# Altium footprint library Horizont_11_12_2017.PcbLib: 257 footprints (part 15 of 17)
Each footprint in its own frame and in the unit in brackets; x right, y up, seen from the top. Pads: shape width x height; smd on the part's side, far side on the other; paste and mask are expansions set on the pad; w line width, h text height; cw(c..) or ccw(c..) is an arc to the next point about the centre after c.
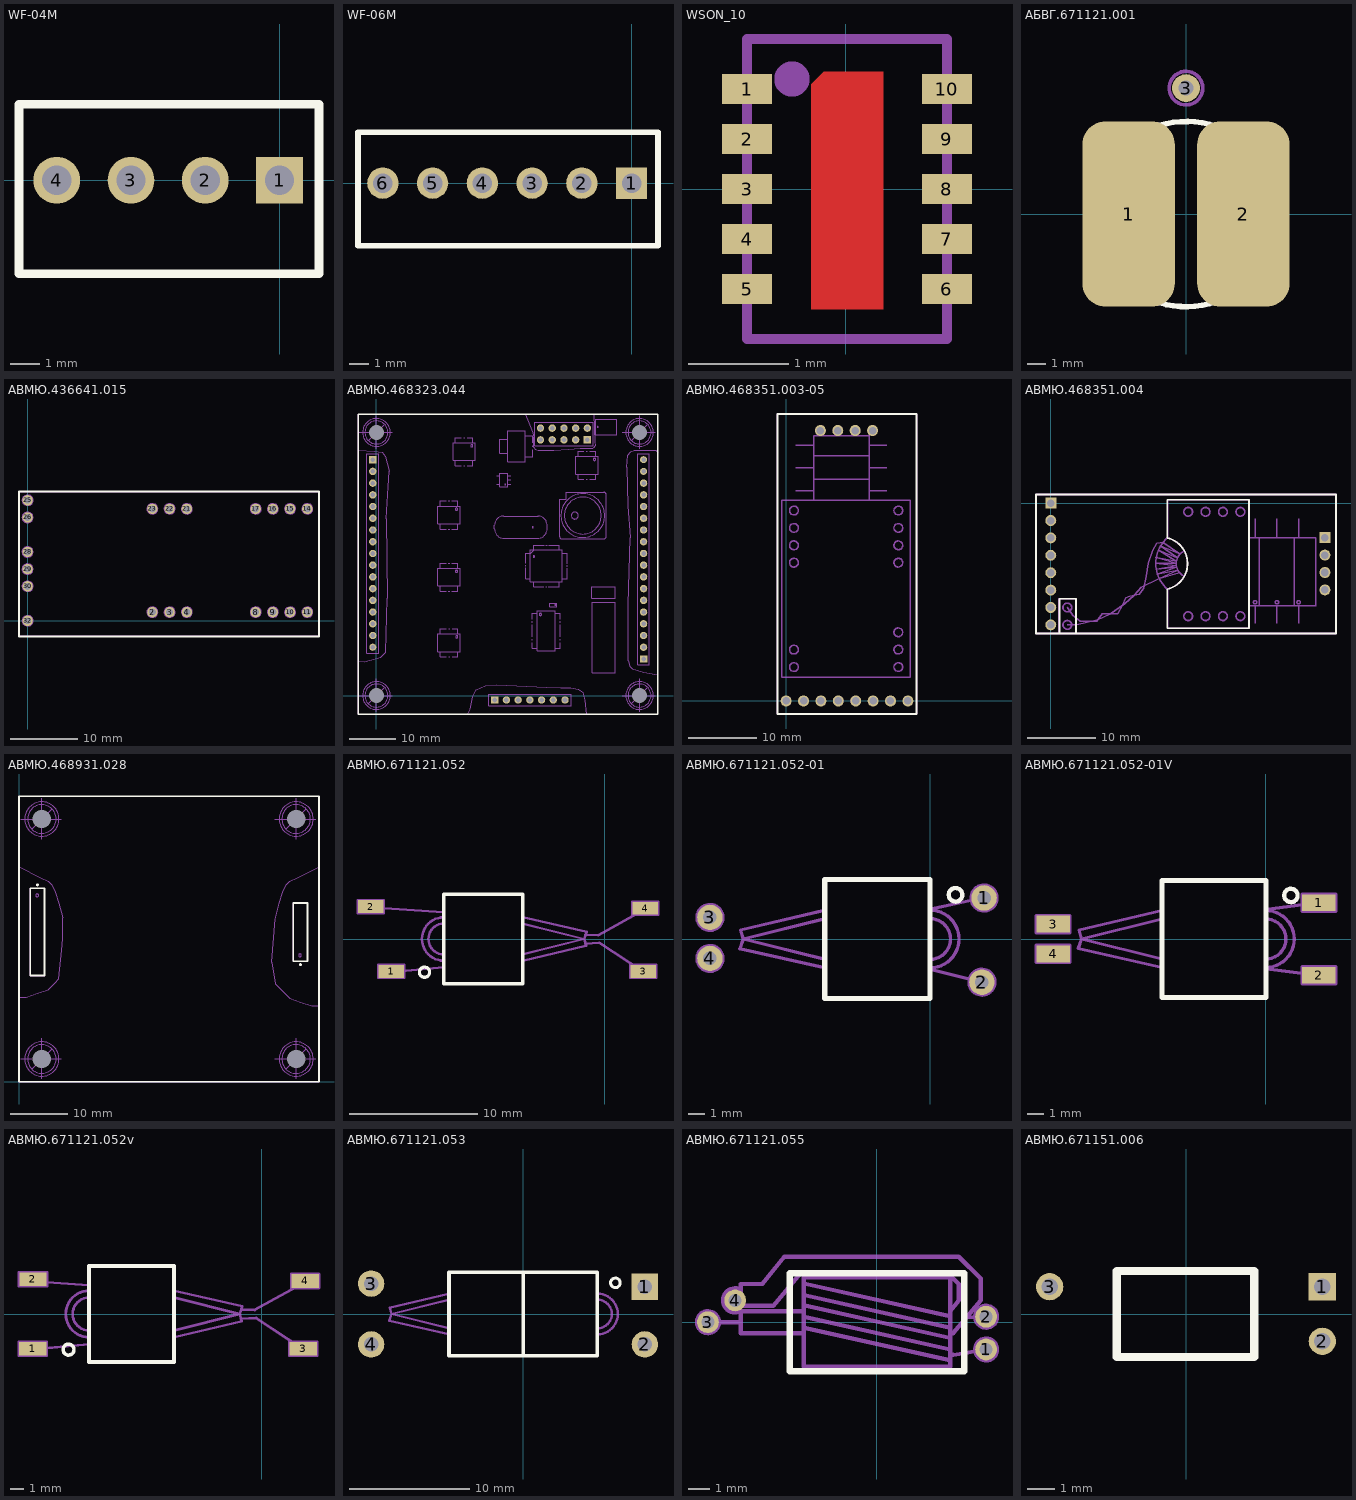
[diagram p14: the footprints below, top view; thin cyan lines are the x and y axes]

## WF-04M [mm]
height 14.2
pads (4):
  rect 1.6x1.6 hole 1: 1(0,0)
  round 1.6 hole 1: 2(-2.54,0) 3(-5.08,0) 4(-7.62,0)
Top Overlay:
  lines w0.3: -8.91,-3.2 1.35,-3.2 1.35,2.6 -8.91,2.6 -8.91,-3.2
Mechanical 1:
  lines w0.2: -8.91,-3.2 1.35,-3.2 1.35,2.6 -8.91,2.6 -8.91,-3.2
  text "1" at -0.35,-0.6 h1.5
  text "4" at -7.9,-0.6 h1.5
  text ".Designator" at -5.81,3.4 h1.5
3D body "WF-04M.STEP": height 11.5, standoff -3.4, extent -8.91,-3.2 1.29,2.6

## WF-06M [mm]
height 14.2
pads (6):
  rect 1.6x1.6 hole 1: 1(0,0)
  round 1.6 hole 1: 2(-2.54,0) 3(-5.08,0) 4(-7.62,0) 5(-10.16,0) 6(-12.7,0)
Top Overlay:
  lines w0.3: -13.97,-3.2 -13.97,2.6 1.35,2.6 1.35,-3.2 -13.97,-3.2
Mechanical 1:
  lines w0.2: -13.97,-3.2 -13.97,2.6 1.35,2.6 1.35,-3.2 -13.97,-3.2
  text ".Designator" at -8.35,3.4 h1.5
  text "6" at -12.7,-0.625 h1.5
  text "1" at -0.35,-0.6 h1.5
3D body "WF-06M.STEP": height 11.5, standoff -3.4, extent -14,-3.2 1.3,2.6

## WSON_10 [mm]
pads (10):
  rect 0.5x0.3 smd: 1(-0.99,1) 2(-0.99,0.5) 3(-0.99,0) 4(-0.99,-0.5) 5(-0.99,-1) 6(1.01,-1) 7(1.01,-0.5) 8(1.01,0) 9(1.01,0.5) 10(1.01,1)
Top Layer:
  region: -0.415,1.25
  region: -0.35,1.05 -0.225,1.175 0.375,1.175 0.375,-1.2 -0.35,-1.2
Top Solder:
  rectangle: -0.44,-1.3 0.46,1.3
Mechanical 1:
  circle w0.254: c-0.54,1.1 r0.05
  lines w0.1: -0.991,-1.5 1.011,-1.5 1.011,1.5 -0.991,1.5 -0.991,-1.5
3D body "User Library-TPS62177DQCT.step": height 0.7, standoff -0.05, extent -0.991,-1.5 1.011,1.5
3D body: height 0.1, standoff 0, extent -0.965,1 -0.965,1

## АБВГ.671121.001 [mm]
height 6
pads (3):
  rrect50% 5x10 smd: 1(-3.1,0) 2(3.1,0)
  round 1.5 hole 0.8: 3(0,6.8)
Top Overlay:
  circle w0.3: c0,0 r5
Mechanical 1:
  circle w0.2: c0,6.8 r0.906
  circle w0.2: c0,0 r5
  circle w0.1: c-3.2,0 r0.1
  text "3" at 1.4,6.9 h1.5
  text ".Designator" at -1.6,0.3 h1.5
3D body "АБВГ.671121.stp": height 6, standoff 0, extent -4.955,-4.975 4.955,4.975

## АВМЮ.436641.015 [mil]
pads (20):
  round 60 hole 40: 2(725,50) 3(825,50) 8(1325,50) 9(1425,50) 10(1525,50) 11(1625,50) 14(1625,650) 15(1525,650) 16(1425,650) 17(1325,650) 21(925,650) 22(825,650) 25(0,700) 26(0,600) 28(0,400) 29(0,300) 30(0,200) 32(0,0)
  round 60 hole 40 unplated: 4(925,50) 23(725,650)
Top Overlay:
  lines w11.81: -50,-90.55 1692.91,-90.55 1692.91,750 -50,750 -50,-90.55
Mechanical 1:
  circle w7.87: c0,0 r30
  circle w7.87: c0,200 r30
  circle w7.87: c0,300 r30
  circle w7.87: c0,400 r30
  circle w7.87: c0,600 r30
  circle w7.87: c0,700 r30
  circle w7.87: c725,650 r30
  circle w7.87: c825,650 r30
  circle w7.87: c925,650 r30
  circle w7.87: c1325,650 r30
  circle w7.87: c1425,650 r30
  circle w7.87: c1525,650 r30
  circle w7.87: c1625,650 r30
  circle w7.87: c1625,50 r30
  circle w7.87: c1525,50 r30
  circle w7.87: c1425,50 r30
  circle w7.87: c1325,50 r30
  circle w7.87: c925,50 r30
  circle w7.87: c825,50 r30
  circle w7.87: c725,50 r30
  lines w7.87: -50,-90.55 -50,750 1692.91,750 1692.91,-90.55 -50,-90.55
  text "32" at 41.06,-20.98 h78.74
  text "30" at 41.06,179.02 h78.74
  text "29" at 41.06,279.02 h78.74
  text "28" at 41.06,379.02 h78.74
  text "26" at 41.06,579.02 h78.74
  text "25" at 41.06,679.02 h78.74
  text "21" at 900,695 h78.74
  text "23" at 696.06,694.02 h78.74
  text "22" at 800,695 h78.74
  text "15" at 1500,695 h78.74
  text "16" at 1396.06,694.02 h78.74
  text "17" at 1296.06,694.02 h78.74
  text "14" at 1600,695 h78.74
  text "11" at 1600,-50 h78.74
  text "8" at 1311.06,-50.98 h78.74
  text "9" at 1411.06,-50.98 h78.74
  text "10" at 1500,-50 h78.74
  text "4" at 911.06,-50.98 h78.74
  text "3" at 811.06,-50.98 h78.74
  text "2" at 711.06,-50.98 h78.74
  text ".Designator" at 765,330 h59.06
3D body "АВМЮ.436641.015.stp": height 551.55, standoff -117.49, extent -44.81,-96.92 1696.13,751.12

## АВМЮ.468323.044 [mm]
pads (56):
  round 0 hole 3.2 unplated mask+3: 0(0,0) 0(0,57) 0(57,0) 0(57,57)
  rect 1.6x1.6 hole 1: XP1_1(-0.8,51.106) XP2_1(25.616,-0.964) XP3_1(57.874,7.926) XP4_1(45.701,55.394)
  round 1.6 hole 1: XP1_2(-0.8,48.566) XP1_3(-0.8,46.026) XP1_4(-0.8,43.486) XP1_5(-0.8,40.946) XP1_6(-0.8,38.406) XP1_7(-0.8,35.866) XP1_8(-0.8,33.326) XP1_9(-0.8,30.786) XP1_10(-0.8,28.246) XP1_11(-0.8,25.706) XP1_12(-0.8,23.166) XP1_13(-0.8,20.626) XP1_14(-0.8,18.086) XP1_15(-0.8,15.546) XP1_16(-0.8,13.006) XP2_2(28.156,-0.964) XP2_3(30.696,-0.964) XP2_4(33.236,-0.964) XP2_5(35.776,-0.964) XP2_6(38.316,-0.964) XP2_7(40.856,-0.964) XP3_2(57.874,10.466) XP3_3(57.874,13.006) XP3_4(57.874,15.546) XP3_5(57.874,18.086) XP3_6(57.874,20.626) XP3_7(57.874,23.166) XP3_8(57.874,25.706) XP3_9(57.874,28.246) XP3_10(57.874,30.786) XP3_11(57.874,33.326) XP3_12(57.874,35.866) XP3_13(57.874,38.406) XP3_14(57.874,40.946) XP3_15(57.874,43.486) XP3_16(57.874,46.026) XP4_2(45.701,57.934) XP4_3(43.161,55.394) XP4_4(43.161,57.934) XP4_5(40.621,55.394) XP4_6(40.621,57.934) XP4_7(38.081,55.394) XP4_8(38.081,57.934) XP4_9(35.541,55.394) XP4_10(35.541,57.934)
  round 1.524 hole 0.965: XP1_17(-0.8,10.466) XP3_17(57.874,48.566) XP3_18(57.874,51.106)
Top Overlay:
  lines w0.3: -4,-4 61,-4 61,61 -4,61 -4,-4
Mechanical 1:
  drawing of 282 lines, arcs and shapes, not listed
  text "17" at -0.543,10.99 h1.5
  text "1" at -0.543,51.234 h1.5
  text "18" at 58.417,50.382 h1.5
  text "1" at 58.417,7.598 h1.5
  text "1" at 25.262,-1.456 h1.5
  text "7" at 40.416,-1.514 h1.5
  text "9" at 35.3,54.9 h1.5
  text "1" at 45.5,55 h1.5
  text "10" at 35.2,57.4 h1.5
  text "2" at 45.309,57.472 h1.5
  text ".Designator" at 24.6,58.8 h1.5
  text "XP1" at -0.4,29.7 h1.5
  text "XP2" at 31.5,-1.4 h1.5
  text "XP3" at 58.1,29.1 h1.5
  text "XP4" at 39.9,56.3 h1.5
Mechanical 2:
  circle w0.2: c0,0 r2.5
  circle w0.2: c0,0 r3
  circle w0.2: c57,0 r2.5
  circle w0.2: c57,0 r3
  circle w0.2: c57,57 r2.5
  circle w0.2: c57,57 r3
  circle w0.2: c0,57 r2.5
  circle w0.2: c0,57 r3
  lines w0.1: -3.7,0 3.4,0 ; -3.7,57 3.4,57 ; 0,-3.5 0,3.6 ; 0,53.5 0,60.6 ; 53.3,0 60.4,0 ; 53.3,57 60.4,57 ; 57,-3.5 57,3.6 ; 57,53.5 57,60.6
  lines w0.2: -1.7,-1.7 0,0 1.7,1.7 ; -1.7,55.3 0,57 1.7,58.7 ; 55.3,-1.7 57,0 58.7,1.7 ; 55.3,55.3 57,57 58.7,58.7
3D body "АВМЮ.468323.044.stp": height 12.81, standoff -3.08, extent -4,-4 61,61

## АВМЮ.468351.003-05 [mm]
height 12
pads (12):
  round 1.6 hole 1.1: XP1_1(0,0) XP1_2(2.54,0) XP1_3(5.08,0) XP1_4(7.62,0) XP1_5(10.16,0) XP1_6(12.7,0) XP1_7(15.24,0) XP1_8(17.78,0) XP2_1(5.004,39.497) XP2_2(7.544,39.497) XP2_3(10.084,39.497) XP2_4(12.624,39.497)
Top Overlay:
  lines w0.254: -1.27,-1.905 19.05,-1.905 19.05,41.91 -1.27,41.91 -1.27,-1.905
Mechanical 1:
  circle w0.2: c12.624,39.497 r0.635
  circle w0.2: c10.084,39.497 r0.635
  circle w0.2: c7.544,39.497 r0.635
  circle w0.2: c5.004,39.497 r0.635
  circle w0.2: c17.78,0 r0.635
  circle w0.2: c15.24,0 r0.635
  circle w0.2: c12.7,0 r0.635
  circle w0.2: c10.16,0 r0.635
  circle w0.2: c7.62,0 r0.635
  circle w0.2: c5.08,0 r0.635
  circle w0.2: c2.54,0 r0.635
  circle w0.2: c0,0 r0.635
  circle w0.2: c16.383,7.493 r0.635
  circle w0.2: c16.383,4.953 r0.635
  circle w0.2: c1.143,7.493 r0.635
  circle w0.2: c1.143,4.953 r0.635
  circle w0.2: c16.383,10.033 r0.635
  circle w0.2: c16.383,22.733 r0.635
  circle w0.2: c16.383,20.193 r0.635
  circle w0.2: c1.143,22.733 r0.635
  circle w0.2: c1.143,20.193 r0.635
  circle w0.2: c16.383,27.813 r0.635
  circle w0.2: c16.383,25.273 r0.635
  circle w0.2: c1.143,27.813 r0.635
  circle w0.2: c1.143,25.273 r0.635
  lines w0.2: 1.397,30.734 4,30.734 ; 1.397,34.036 4,34.036 ; 1.397,37.338 4,37.338 ; 4,29.337 4,33.528 ; 4,31.242 4,36.83 ; 4,32.385 12.128,32.385 ; 4,34.544 4,38.735 12.128,38.735 12.128,34.544 ; 4,35.814 12.128,35.814 ; 12.128,29.337 12.128,33.528 ; 12.128,30.734 14.732,30.734 ; 12.128,31.242 12.128,36.83 ; 12.128,34.036 14.732,34.036 ; 12.128,37.338 14.732,37.338 ; 19.05,41.889 19.05,-1.905 -1.27,-1.905 -1.27,41.91 19.05,41.91 ; -0.635,3.429 18.161,3.429 18.161,29.337 -0.635,29.337 -0.635,3.429
  text ".Designator" at 6.5,16.5 h1.5
  text "8" at 17.78,1.143 h1.5
  text "XP1" at 7.239,1.524 h1.5
  text "1" at -0.823,0.913 h1.5
  text "4" at 12.446,40.64 h1.5
  text "1" at 5,40.5 h1.5
  text "XP2" at 0.127,39.624 h1.5
3D body "АВМЮ.468351.003-05.step": height 13.31, standoff -3.08, extent -1.524,-1.905 19.05,42.164

## АВМЮ.468351.004 [mm]
pads (12):
  rect 1.6x1.6 hole 1.1: XP1_1(0,0) XP3_1(40.035,-5.05)
  round 1.6 hole 1.1: XP1_2(0,-2.54) XP1_3(0,-5.08) XP1_4(0,-7.62) XP1_5(0,-10.16) XP1_6(0,-12.7) XP1_7(0,-15.24) XP1_8(0,-17.78) XP3_2(40.035,-7.59) XP3_3(40.035,-10.13) XP3_4(40.035,-12.67)
Top Overlay:
  lines w0.254: 1.27,-19.05 1.27,-13.97 3.683,-13.97 3.683,-19.05 ; -2.159,-19.05 -2.159,1.27 41.656,1.27 41.656,-19.05 -2.159,-19.05 ; 17.018,-18.288 17.018,-12.573 ccw(c16.129,-8.826) 17.018,-5.08 17.018,0.508 28.956,0.508 28.956,-18.288 17.018,-18.288
Bottom Overlay:
  lines w0.25: -1.27,-19.05 1.27,-19.05 ; -1.27,1.27 1.27,1.27
Mechanical 1:
  circle w0.25: c22.606,-16.51 r0.635
  circle w0.25: c20.066,-16.51 r0.635
  circle w0.25: c22.606,-1.27 r0.635
  circle w0.25: c20.066,-1.27 r0.635
  circle w0.2: c29.845,-14.478 r0.254
  circle w0.25: c27.686,-16.51 r0.635
  circle w0.25: c27.686,-1.27 r0.635
  circle w0.2: c36.195,-14.478 r0.254
  circle w0.25: c2.413,-15.24 r0.635
  circle w0.25: c2.413,-17.78 r0.635
  circle w0.25: c25.146,-16.51 r0.635
  circle w0.2: c33.02,-14.478 r0.254
  circle w0.25: c25.146,-1.27 r0.635
  lines w0.2: 2.413,-17.78 3.81,-17.78 6.858,-17.018 8.636,-16.256 10.795,-14.732 12.192,-13.462 13.208,-12.319 15.748,-11.049 ; 2.413,-15.24 3.175,-16.383 4.318,-17.272 6.731,-17.272 7.493,-16.129 9.779,-16.129 10.414,-14.986 10.922,-13.843 11.557,-13.589 12.954,-13.335 13.589,-12.446 13.97,-10.668 14.224,-8.763 14.859,-6.858 15.494,-5.842 16.51,-5.715 ; 16.383,-5.715 18.923,-7.493 ; 17.017,-12.573 cw(c20.32,-8.826) 17.017,-5.08 ; 17.054,0.516 28.958,0.516 28.958,-18.28 17.056,-18.28 ; 17.066,-18.31 17.066,-12.51 ; 17.066,-5.11 17.066,0.49 ; 17.068,-12.51 ccw(c16.166,-8.81) 17.068,-5.11 ; 18.415,-8.001 15.748,-6.858 18.288,-8.509 15.24,-7.874 18.288,-8.763 15.24,-8.763 18.288,-9.144 15.367,-9.652 18.288,-9.398 15.494,-10.414 18.542,-9.779 15.748,-11.049 ; 18.415,-7.874 16.002,-6.223 18.796,-7.366 ; 18.796,-10.16 15.748,-11.049 ; 19.4,-7.051 ccw(c20.32,-8.826) 19.45,-10.627 ; 28.956,-14.986 38.735,-14.986 38.735,-5.08 28.956,-5.08 ; 29.845,-17.526 29.845,-14.986 ; 29.845,-5.08 29.845,-2.286 ; 30.48,-14.986 30.48,-5.08 ; 30.52,-5.036 35.52,-5.036 ; 33.02,-17.526 33.02,-14.986 ; 33.02,-5.08 33.02,-2.286 ; 33.695,-5.036 38.695,-5.036 ; 35.56,-14.986 35.56,-5.08 ; 36.195,-17.526 36.195,-14.986 ; 36.195,-5.08 36.195,-2.286 ; 38.695,-15.026 38.695,-5.026 ; 1.143,-19.05 1.143,-13.97 3.683,-13.97 3.683,-19.05 1.143,-19.05
  lines w0.254: -2.159,-19.05 -2.159,1.27 41.656,1.27 41.656,-19.05 -2.159,-19.05
  text "XP3" at 40.4,-10.1 h1.5
  text "XP1" at 0.1,-10 h1.5
  text "1" at -0.9,-0.2 h1.5
  text ".Comment" at 6.2,-2.3 h1.5
  text ".Designator" at 8.03,-0.74 h1.5
  text "1" at 40.5,-3.6 h1.5
  text "4" at 40.5,-14.2 h1.5
  text "8" at -1.1,-17.9 h1.5
3D body "АВМЮ.468351.004.stp": height 12.21, standoff -3, extent -2.159,-19.05 41.91,1.524

## АВМЮ.468931.028 [mm]
pads (4):
  round 0 hole 3.2 unplated mask+3: 0(4,4) 0(4,46) 0(48.5,4) 0(48.5,46)
Top Overlay:
  circle w0.3: c3.219,34.48 r0.1
  circle w0.3: c49.252,20.52 r0.1
  lines w0.3: 0,0 0,50 52.5,50 52.5,0 0,0 ; 1.969,18.61 4.469,18.61 4.469,33.87 1.969,33.87 1.969,18.61 ; 48.002,21.13 48.002,31.31 50.502,31.31 50.502,21.13 48.002,21.13
Mechanical 1:
  circle w0.2: c49.175,22.139 r0.254
  circle w0.2: c3.175,32.639 r0.254
  circle w0.2: c4,4 r3
  circle w0.2: c4,4 r2.5
  circle w0.2: c48.5,4 r2.5
  circle w0.2: c48.5,4 r3
  circle w0.2: c48.5,46 r2.5
  circle w0.2: c48.5,46 r3
  circle w0.2: c4,46 r2.5
  circle w0.2: c4,46 r3
  lines w0.1: 0,14.835 1.27,14.835 3.175,15.47 5.08,16.105 6.35,17.375 6.985,18.01 7.5,23 7.62,25 7.62,28.75 6.985,31.29 6.35,33.195 5.715,34.465 5.08,35.1 3.81,35.735 0,37.64 ; 0.3,4 7.4,4 ; 0.3,46 7.4,46 ; 4,0.5 4,7.6 ; 4,42.5 4,49.6 ; 44.8,4 51.9,4 ; 44.8,46 51.9,46 ; 44.873,28.488 45.515,31.29 46.15,33.195 46.785,34.465 47.42,35.1 48.69,35.735 52.5,37.64 ; 44.88,28.575 44.245,20.955 44.88,17.145 45.515,16.51 46.15,15.875 47.42,14.605 49.325,13.97 51.23,13.335 52.5,13.335 ; 48.5,0.5 48.5,7.6 ; 48.5,42.5 48.5,49.6
  lines w0.2: 2.3,2.3 4,4 5.7,5.7 ; 2.3,44.3 4,46 5.7,47.7 ; 46.8,2.3 48.5,4 50.2,5.7 ; 46.8,44.3 48.5,46 50.2,47.7 ; 0,0 0,50 52.5,50 52.5,0 0,0 ; 1.969,18.61 4.469,18.61 4.469,33.87 1.969,33.87 1.969,18.61 ; 48.002,21.13 48.002,31.31 50.502,31.31 50.502,21.13 48.002,21.13
  text "6" at 3.5,19.5 h1.5
  text "4" at 49.633,29.659 h1.5
  text ".Designator" at 25,47.5 h1.5
Mechanical 2:
  circle w0.2: c4,4 r2.5
  circle w0.2: c4,4 r3
  circle w0.2: c48.5,4 r3
  circle w0.2: c48.5,4 r2.5
  circle w0.2: c48.5,46 r3
  circle w0.2: c48.5,46 r2.5
  circle w0.2: c4,46 r3
  circle w0.2: c4,46 r2.5
  lines w0.1: 0.3,4 7.4,4 ; 0.3,46 7.4,46 ; 4,0.5 4,7.6 ; 4,42.5 4,49.6 ; 44.8,4 51.9,4 ; 44.8,46 51.9,46 ; 48.5,0.5 48.5,7.6 ; 48.5,42.5 48.5,49.6
  lines w0.2: 2.3,2.3 4,4 5.7,5.7 ; 2.3,44.3 4,46 5.7,47.7 ; 46.8,2.3 48.5,4 50.2,5.7 ; 46.8,44.3 48.5,46 50.2,47.7
3D body "АВМЮ.468931.028.stp": height 15.12, standoff -3.68, extent 0,0 52.5,50

## АВМЮ.671121.052 [mm]
height 4.2
pads (4):
  rect 2x1 smd: 1(-16.7,-2.54) 2(-18.295,2.54) 3(3.048,-2.54) 4(3.175,2.413)
Top Overlay:
  circle w0.254: c-14.1,-2.6 r0.4
  lines w0.3: -12.6,-3.5 -12.6,3.5 ; -12.6,-3.5 -6.4,-3.5 -6.4,3.5 -12.6,3.5 ; -12.6,-3.5 -12.6,3.5
Mechanical 1:
  lines w0.2: -18.4,2.5 -12.6,2.1 ; -16.8,-2.6 -12.6,-2.2 ; -12.6,-1.7 cw(c-12.6,0) -12.6,1.7 ; -12.6,-1.2 cw(c-12.6,0) -12.6,1.2 ; -6.4,-1.7 -1.448,-0.531 -1.6,0 ; -6.4,-1.2 -1.6,0 ; -6.4,1.2 -1.6,0 ; -6.4,1.7 -1.408,0.565 -1.6,0 ; -1.498,-0.356 -0.4,-0.3 3.1,-2.6 ; -1.489,0.326 -0.5,0.3 3.3,2.4 ; -19.311,2.032 -17.279,2.032 -17.279,3.048 -19.311,3.048 -19.311,2.032 ; -17.716,-3.048 -15.684,-3.048 -15.684,-2.032 -17.716,-2.032 -17.716,-3.048 ; -12.6,-3.5 -6.4,-3.5 -6.4,3.5 -12.6,3.5 -12.6,-3.5 ; 2.032,-3.048 4.064,-3.048 4.064,-2.032 2.032,-2.032 2.032,-3.048 ; 2.159,1.905 2.159,2.921 4.191,2.921 4.191,1.905 2.159,1.905
  text "2" at -18.7,0.4 h2
  text "1" at -17.1,-1.6 h2
  text "3" at 4.445,-3.175 h2
  text "4" at 4.572,1.651 h2
  text ".Designator" at -6.1,4.3 h1.5
3D body "АВМЮ.671121.052.STEP": height 4.2, standoff 0, extent -14.75,-3.5 -1.311,3.5

## АВМЮ.671121.052-01 [mm]
height 4.2
pads (4):
  round 1.5 hole 0.8: 1(3.175,2.413) 2(3.048,-2.54) 3(-12.954,1.27) 4(-12.954,-1.143)
Top Overlay:
  circle w0.254: c1.5,2.6 r0.4
  lines w0.3: 0,-3.5 0,3.5 ; 0,-3.5 0,3.5 ; 0,-3.5 -6.2,-3.5 -6.2,3.5 0,3.5
Mechanical 1:
  circle w0.2: c3.048,-2.54 r0.762
  circle w0.2: c3.175,2.413 r0.762
  circle w0.2: c-12.954,-1.143 r0.762
  circle w0.2: c-12.954,1.27 r0.762
  lines w0.2: -6.2,-1.7 -11.192,-0.565 -11,0 ; -6.2,-1.2 -11,0 ; -6.2,1.2 -11,0 ; -6.2,1.7 -11.152,0.531 -11,0 ; 0,-1.778 3.048,-2.54 ; 0,-1.7 ccw(c0,0) 0,1.7 ; 0,-1.2 ccw(c0,0) 0,1.2 ; 0.127,1.778 3.048,2.413 ; -6.2,-3.5 -6.2,3.5 0,3.5 0,-3.5 -6.2,-3.5
  text "3" at -11.43,1.778 h2
  text "4" at -11.557,-3.175 h2
  text "2" at 4.445,-3.175 h2
  text "1" at 4.572,1.651 h2
  text ".Designator" at -6.1,4.3 h1.5
3D body "АВМЮ.671121.052.STEP": height 4.2, standoff 0, extent -11.22,-3.5 2.22,3.5

## АВМЮ.671121.052-01V [mm]
height 3.2
pads (4):
  rect 2x1 smd: 1(3.175,2.159) 2(3.175,-2.159) 3(-12.7,0.889) 4(-12.7,-0.889)
Top Overlay:
  circle w0.254: c1.5,2.6 r0.4
  lines w0.3: 0,-3.5 -6.2,-3.5 -6.2,3.5 0,3.5 ; 0,-3.5 0,3.5 ; 0,-3.5 0,3.5
Mechanical 1:
  lines w0.2: -6.2,-1.7 -11.192,-0.565 -11,0 ; -6.2,-1.2 -11,0 ; -6.2,1.2 -11,0 ; -6.2,1.7 -11.152,0.531 -11,0 ; 0,-1.778 3.048,-2.159 ; 0,-1.7 ccw(c0,0) 0,1.7 ; 0,-1.2 ccw(c0,0) 0,1.2 ; 0.127,1.778 3.048,2.159 ; -13.716,-1.397 -13.716,-0.381 -11.684,-0.381 -11.684,-1.397 -13.716,-1.397 ; -13.716,0.381 -13.716,1.397 -11.684,1.397 -11.684,0.381 -13.716,0.381 ; -6.2,-3.5 0,-3.5 0,3.5 -6.2,3.5 -6.2,-3.5 ; 2.159,-2.667 2.159,-1.651 4.191,-1.651 4.191,-2.667 2.159,-2.667 ; 2.159,1.651 4.191,1.651 4.191,2.667 2.159,2.667 2.159,1.651
  text ".Designator" at -6.1,4.3 h1.5
  text "1" at 4.572,1.397 h2
  text "2" at 4.572,-2.794 h2
  text "4" at -11.176,-2.54 h2
  text "3" at -11.176,1.27 h2
3D body "АВМЮ.671121.052.STEP": height 3.2, standoff -1, extent -11.22,-3.5 2.22,3.5

## АВМЮ.671121.052v [mm]
height 4.2
pads (4):
  rect 2x1 smd: 1(-16.7,-2.54) 2(-16.695,2.54) 3(3.048,-2.54) 4(3.175,2.413)
Top Overlay:
  circle w0.254: c-14.1,-2.6 r0.4
  lines w0.3: -12.6,-3.5 -12.6,3.5 ; -12.6,-3.5 -6.4,-3.5 -6.4,3.5 -12.6,3.5 ; -12.6,-3.5 -12.6,3.5
Mechanical 1:
  lines w0.2: -16.8,-2.6 -12.6,-2.2 ; -16.708,2.383 -12.6,2.1 ; -12.6,-1.7 cw(c-12.6,0) -12.6,1.7 ; -12.6,-1.2 cw(c-12.6,0) -12.6,1.2 ; -6.4,-1.7 -1.448,-0.531 -1.6,0 ; -6.4,-1.2 -1.6,0 ; -6.4,1.2 -1.6,0 ; -6.4,1.7 -1.408,0.565 -1.6,0 ; -1.498,-0.356 -0.4,-0.3 3.1,-2.6 ; -1.489,0.326 -0.5,0.3 3.3,2.4 ; -17.716,-3.048 -17.716,-2.032 -15.684,-2.032 -15.684,-3.048 -17.716,-3.048 ; -17.711,2.032 -17.711,3.048 -15.679,3.048 -15.679,2.032 -17.711,2.032 ; -12.6,-3.5 -12.6,3.5 -6.4,3.5 -6.4,-3.5 -12.6,-3.5 ; 2.032,-3.048 2.032,-2.032 4.064,-2.032 4.064,-3.048 2.032,-3.048 ; 2.159,1.905 4.191,1.905 4.191,2.921 2.159,2.921 2.159,1.905
  text ".Designator" at -6.1,4.3 h1.5
  text "4" at 4.572,1.651 h2
  text "3" at 4.445,-3.175 h2
  text "1" at -17.1,-1.6 h2
  text "2" at -17.1,0.4 h2
3D body "АВМЮ.671121.052.STEP": height 4.2, standoff 0, extent -14.75,-3.5 -1.311,3.5

## АВМЮ.671121.053 [mm]
height 4.2
pads (4):
  rect 2.2x2.2 hole 1.2: 1(10.16,2.286)
  round 2.2 hole 1.2: 2(10.16,-2.54) 3(-12.7,2.54) 4(-12.7,-2.54)
Top Overlay:
  circle w0.254: c7.7,2.6 r0.4
  lines w0.3: 0,-3.5 0,3.5 ; -6.2,-3.5 6.2,-3.5 6.2,3.5 -6.2,3.5 -6.2,-3.5
Mechanical 1:
  lines w0.2: -6.2,-1.7 -11.192,-0.565 -11,0 ; -6.2,-1.2 -11,0 ; -6.2,1.2 -11,0 ; -6.2,1.7 -11.152,0.531 -11,0 ; 6.2,-1.7 ccw(c6.2,0) 6.2,1.7 ; 6.2,-1.2 ccw(c6.2,0) 6.2,1.2 ; 0,-3.5 -6.2,-3.5 -6.2,3.5 0,3.5 ; 0,-3.5 6.2,-3.5 6.2,3.5 0,3.5 ; 0,-3.5 0,3.5
  text "3" at -10.4,2.1 h2
  text "4" at -10.7,-3.4 h2
  text "2" at 12.6,-3.2 h2
  text "1" at 12.5,1.7 h2
  text ".Designator" at -3.1,4.3 h1.5
3D body "АВМЮ.671121.053.STEP": height 4.2, standoff 0, extent -11.22,-3.5 8.42,3.5

## АВМЮ.671121.055 [mm]
height 3.1
pads (4):
  round 1 hole 0.6: 1(5,-1.25) 2(5,0.25) 3(-7.75,0) 4(-6.5,1)
Top Overlay:
  lines w0.3: -4,-2.25 4,-2.25 4,2.25 -4,2.25 -4,-2.25
Mechanical 1:
  circle w0.2: c-7.75,0 r0.5
  circle w0.2: c5,0.25 r0.5
  circle w0.2: c5,-1.25 r0.5
  lines w0.2: -7.75,0 -6.25,0 ; -6.25,1.5 ccw(c-6.5,1) -6.25,0.5 ; -3.35,-0.5 -6.25,-0.5 -6.25,0.5 ; -3.35,-0.25 3.35,-1.75 ; -3.35,0.25 3.35,-1.25 ; -3.35,0.5 -6.25,0.5 ; -3.35,1.25 3.35,-0.25 ; -3.345,0.771 3.355,-0.729 ; -3.25,1.75 3.355,0.271 ; 3.35,-0.5 3.5,-0.5 4.75,1 4.75,2 3.75,3 -4.25,3 -5.25,1.75 -6.25,1.75 -6.25,0.75 -4.75,0.75 -3.5,2.25 3.25,2.25 3.75,1.75 3.75,1 3.35,0.5 ; 3.5,-1.5 5,-1.25 ; 4.095,0.214 5,0.25 ; -3.35,-2.05 -3.35,2.05 3.35,2.05 3.35,-2.05 -3.35,-2.05
  text "1" at 6.46,-2 h2
  text "4" at -6.79,2.25 h2
  text "3" at -9.79,-0.75 h2
  text ".Designator" at -2.75,3.75 h1.5
  text "2" at 6.46,-0.25 h2
3D body "АВМЮ.671121.055.stp": height 3.05, standoff -1.05, extent -6.425,-2.034 4.925,3.046

## АВМЮ.671151.006 [mm]
height 3
pads (3):
  rect 1x1 hole 0.6: 1(5,1)
  round 1 hole 0.6: 2(5,-1) 3(-5,1)
Top Overlay:
  lines w0.3: -2.54,1.575 -2.54,-1.575 2.5,-1.575 2.5,1.575 -2.5,1.575
Mechanical 1:
  lines w0.2: -2.5,-1.575 2.5,-1.575 2.5,1.575 -2.5,1.575 -2.5,-1.575
  text ".Designator" at -1.1,2.3 h1.5
  text "2" at 6.5,-1.5 h2
  text "1" at 6.5,0.5 h2
  text "3" at -7,0.5 h2
3D body "2743019447.stp": height 3, standoff 0, extent -2.6,-1.5 2.5,1.65